# Altium footprint library microbuilder.PCBLIB: 422 footprints (part 13 of 27)
Each footprint in its own frame and in the unit in brackets; x right, y up, seen from the top. Pads: shape width x height; smd on the part's side, far side on the other; paste and mask are expansions set on the pad; w line width, h text height; cw(c..) or ccw(c..) is an arc to the next point about the centre after c.
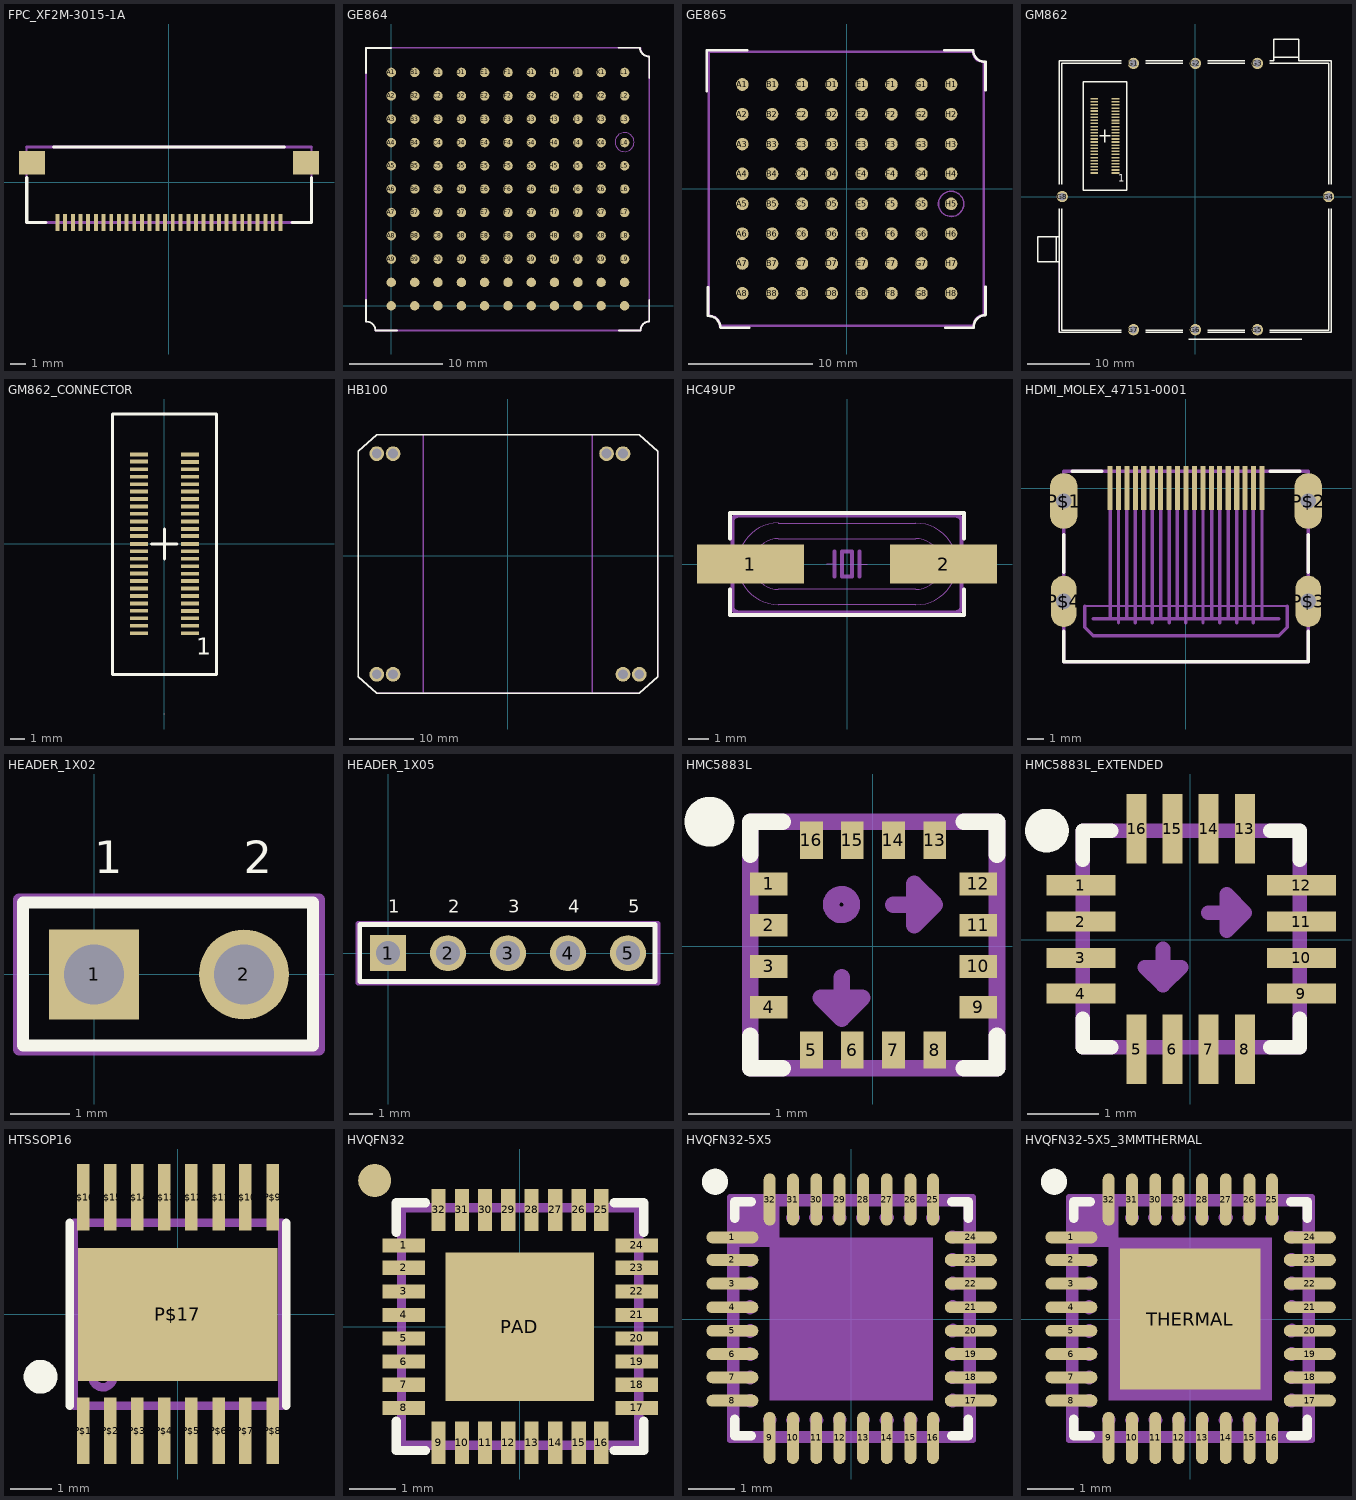
[diagram p12: the footprints below, top view; thin cyan lines are the x and y axes]

## FPC_XF2M-3015-1A [mil]
pads (32):
  rect 10x44 smd: P$1(286,-103.54) P$2(266,-103.54) P$3(247,-103.54) P$4(227,-103.54) P$5(207,-103.54) P$6(188,-103.54) P$7(168,-103.54) P$8(148,-103.54) P$9(128,-103.54) P$10(109,-103.54) P$11(89,-103.54) P$12(69,-103.54) P$13(50,-103.54) P$14(30,-103.54) P$15(10,-103.54) P$16(-9.84,-103.54) P$17(-29.53,-103.54) P$18(-49.21,-103.54) P$19(-68.9,-103.54) P$20(-88.58,-103.54) P$21(-108.27,-103.54) P$22(-127.95,-103.54) P$23(-147.64,-103.54) P$24(-167.32,-103.54) P$25(-187.01,-103.54) P$26(-206.69,-103.54) P$27(-226.38,-103.54) P$28(-246.06,-103.54) P$29(-265.75,-103.54) P$30(-285.43,-103.54)
  rect 67x60 smd: SUPPORT1(351,50) SUPPORT2(-350.39,50)
Top Overlay:
  lines w8: -364.17,11 -364.17,-103.54 -314.96,-103.54 ; -295.28,90 296,90 ; 315,-103.54 365,-103.54 365,11
Mechanical 16:
  lines w5: -364.17,-103.54 -364.17,90 ; 365,-103.54 365,90
  lines w8: -364.17,-103.54 365,-103.54 ; -364.17,90 365,90
  text "Top" at -352.5,-51.57 h24.8
  text "1" at -290,-51.57 h24.8
  text "30" at 273,-51.57 h24.8
  text "1" at 283,-74.07 h24.8
  text "30" at -297.5,-74.07 h24.8
  text "Bot" at -347.5,-74.07 h24.8

## GE864 [mil]
pads (121):
  rrect100% 40x40 smd: A1(0,985) A2(0,886) A3(0,788) A4(0,689) A5(0,591) A6(0,493) A7(0,394) A8(0,296) A9(0,197) A10(0,99) A11(0,0) B1(99,985) B2(99,886) B3(99,788) B4(99,689) B5(99,591) B6(99,493) B7(99,394) B8(99,296) B9(99,197) B10(99,99) B11(99,0) C1(197,985) C2(197,886) C3(197,788) C4(197,689) C5(197,591) C6(197,493) C7(197,394) C8(197,296) C9(197,197) C10(197,99) C11(197,0) D1(296,985) D2(296,886) D3(296,788) D4(296,689) D5(296,591) D6(296,493) D7(296,394) D8(296,296) D9(296,197) D10(296,99) D11(296,0) E1(394,985) E2(394,886) E3(394,788) E4(394,689) E5(394,591) E6(394,493) E7(394,394) E8(394,296) E9(394,197) E10(394,99) E11(394,0) F1(493,985) F2(493,886) F3(493,788) F4(493,689) F5(493,591) F6(493,493) F7(493,394) F8(493,296) F9(493,197) F10(493,99) F11(493,0) G1(591,985) G2(591,886) G3(591,788) G4(591,689) G5(591,591) G6(591,493) G7(591,394) G8(591,296) G9(591,197) G10(591,99) G11(591,0) H1(689,985) H2(689,886) H3(689,788) H4(689,689) H5(689,591) H6(689,493) H7(689,394) H8(689,296) H9(689,197) H10(689,99) H11(689,0) J1(788,985) J2(788,886) J3(788,788) J4(788,689) J5(788,591) J6(788,493) J7(788,394) J8(788,296) J9(788,197) J10(788,99) J11(788,0) K1(886,985) K2(886,886) K3(886,788) K4(886,689) K5(886,591) K6(886,493) K7(886,394) K8(886,296) K9(886,197) K10(886,99) K11(886,0) L1(985,985) L2(985,886) L3(985,788) L4(985,689) L5(985,591) L6(985,493) L7(985,394) L8(985,296) L9(985,197) L10(985,99) L11(985,0)
Top Overlay:
  lines w8: -106,-67 -106,24 ; -106,982 -106,1088 0,1088 ; -105.33,-67.18 cw(c-103.42,-103.63) -66.93,-103.58 ; -66,-104 24,-104 ; 959,1089 1049,1089 ; 961,-105 1052,-105 ; 1050,1089 ccw(c1086.6,1089.53) 1089,1053 ; 1053,-104.33 cw(c1089.25,-102.24) 1089,-65.93 ; 1089,-66 1089,25 ; 1089,961 1089,1052
Mechanical 16:
  lines w5: -104.33,-66.93 cw(c-103.4,-103.4) -66.93,-104.33
  lines w8: -104.33,-66.93 cw(c-104.33,-64.96) -106.3,-64.96 -106.3,1089 1052,1089 ccw(c1088.08,1088.08) 1089,1052 1089,-66.93 ccw(c1088.27,-103.21) 1052,-104.33 -66.93,-104.33
Mechanical 27:
  circle w5: c985,691 r40

## GE865 [mil]
pads (64):
  rrect100% 40x40 smd: A1(-330.71,331) A2(-330.71,237) A3(-330.71,142) A4(-330.71,48) A5(-330.71,-47.24) A6(-330.71,-141.73) A7(-330.71,-236.22) A8(-330.71,-330.71) B1(-236.22,331) B2(-236.22,237) B3(-236.22,142) B4(-236.22,48) B5(-236.22,-47.24) B6(-236.22,-141.73) B7(-236.22,-236.22) B8(-236.22,-330.71) C1(-141.73,331) C2(-141.73,237) C3(-141.73,142) C4(-141.73,48) C5(-141.73,-47.24) C6(-141.73,-141.73) C7(-141.73,-236.22) C8(-141.73,-330.71) D1(-47.24,331) D2(-47.24,237) D3(-47.24,142) D4(-47.24,48) D5(-47.24,-47.24) D6(-47.24,-141.73) D7(-47.24,-236.22) D8(-47.24,-330.71) E1(48,331) E2(48,237) E3(48,142) E4(48,48) E5(48,-47.24) E6(48,-141.73) E7(48,-236.22) E8(48,-330.71) F1(142,331) F2(142,237) F3(142,142) F4(142,48) F5(142,-47.24) F6(142,-141.73) F7(142,-236.22) F8(142,-330.71) G1(237,331) G2(237,237) G3(237,142) G4(237,48) G5(237,-47.24) G6(237,-141.73) G7(237,-236.22) G8(237,-330.71) H1(331,331) H2(331,237) H3(331,142) H4(331,48) H5(331,-47.24) H6(331,-141.73) H7(331,-236.22) H8(331,-330.71)
Top Overlay:
  lines w8: -443.33,310 -443.33,440 -315.33,440 ; -439.39,-402.39 -439.39,-311.39 ; -438.72,-402.57 cw(c-436.82,-439.02) -400.32,-438.98 ; -399.39,-439.39 -309.39,-439.39 ; 310,440 400,440 ; 312,-439.39 403,-439.39 ; 401,439 ccw(c437.1,439.05) 439,403 ; 403,-438.72 cw(c439.24,-436.63) 439,-400.32 ; 440,-399.39 440,-309.39 ; 440,312 440,403
Mechanical 16:
  lines w8: -437.01,-401.57 -437.01,434 401,434 ccw(c431.72,433.7) 433,403 ; -436.76,-402.57 cw(c-433.61,-434.56) -401.5,-433.07 402,-433.07 ; 403,-432.82 cw(c433.74,-431.49) 434,-400.72 434,403
Mechanical 27:
  circle w5: c331,-47.24 r40

## GM862 [mil]
pads (58):
  rect 48x10 smd: 1(-507.8,150) 2(-641.67,150) 3(-507.8,169) 4(-641.67,170) 5(-507.8,189) 6(-641.67,189) 7(-507.8,209) 8(-641.67,209) 9(-507.8,228) 10(-641.67,229) 11(-507.85,248) 12(-641.67,248) 13(-507.8,268) 14(-641.67,268) 15(-507.8,288) 16(-641.67,288) 17(-507.8,307) 18(-641.67,307) 19(-507.8,327) 20(-641.67,327) 21(-507.8,347) 22(-641.67,347) 23(-507.8,366) 24(-641.67,366) 25(-507.8,386) 26(-641.67,386) 27(-507.8,406) 28(-641.67,406) 29(-507.8,425) 30(-641.67,425) 31(-507.8,445) 32(-641.67,445) 33(-507.8,465) 34(-641.67,465) 35(-507.8,484) 36(-641.67,485) 37(-507.8,504) 38(-641.67,504) 39(-507.8,524) 40(-641.67,524) 41(-507.8,543) 42(-641.67,544) 43(-507.8,563) 44(-641.67,563) 45(-507.8,583) 46(-641.67,583) 47(-507.8,603) 48(-641.67,603) 49(-507.8,622) 50(-641.67,622)
  round 72 hole 48: G1(-393.7,847) G2(0,847) G3(394,847) G4(847,0) G5(394,-846.46) G6(0,-846.46) G7(-393.7,-846.46) G8(-846.46,0)
Top Overlay:
  lines w8: -864.17,-78.74 -864.17,-255.91 ; -864.17,79 -864.17,865 -472.44,865 ; -848.43,-78.74 -848.43,-848.43 -472.44,-848.43 ; -848.43,79 -848.43,849 -472.44,849 ; -608.2,386 -541.27,386 ; -574.73,347 -574.73,425 ; -472.44,-864.17 -864.17,-864.17 -864.17,-413.39 ; -314.96,-864.17 -78.74,-864.17 ; -314.96,-848.43 -78.74,-848.43 ; -314.96,849 -78.74,849 ; -314.96,865 -78.74,865 ; -43.31,-905.51 678,-905.51 ; 79,-864.17 315,-864.17 ; 79,-848.43 315,-848.43 ; 79,849 315,849 ; 79,865 315,865 ; 473,-864.17 865,-864.17 865,-78.74 ; 473,-848.43 849,-848.43 849,-78.74 ; 473,849 849,849 849,79 ; 473,865 500,865 500,886 ; 865,79 865,865 658,865 658,886 ; -885.83,-413.39 -1001.97,-413.39 -1001.97,-255.91 -885.83,-255.91 ; -885.83,-413.39 -864.17,-413.39 ; -885.83,-413.39 -885.83,-255.91 ; -885.83,-255.91 -864.17,-255.91 ; -864.17,-413.39 -864.17,-255.91 ; 500,886 500,1002 658,1002 658,886 ; 500,886 658,886 ; -712.6,40 -437.01,40 -437.01,729 -712.6,729 -712.6,40
  text "1" at -490,78 h77.5
Mechanical 16:
  lines w8: -864.17,-864.17 -864.17,-413.39
  text "GSM" at -900,-399 h77.5
  text "GPS" at 517,900 h77.5

## GM862_CONNECTOR [mil]
pads (58):
  rect 48x10 smd: 1(68,-236.85) 2(-66.67,-236.72) 3(68,-217.17) 4(-66.67,-217.03) 5(68,-197.48) 6(-66.67,-197.35) 7(68,-177.8) 8(-66.67,-177.66) 9(68,-158.11) 10(-66.67,-157.98) 11(68,-138.48) 12(-66.67,-138.29) 13(68,-118.74) 14(-66.67,-118.61) 15(68,-99.06) 16(-66.67,-98.92) 17(68,-79.37) 18(-66.67,-79.24) 19(68,-59.69) 20(-66.67,-59.55) 21(68,-40) 22(-66.67,-39.87) 23(68,-20.32) 24(-66.67,-20.18) 25(68,-0.63) 26(-66.67,-0.5) 27(68,20) 28(-66.67,20) 29(68,39) 30(-66.67,39) 31(68,59) 32(-66.67,59) 33(68,79) 34(-66.67,79) 35(68,98) 36(-66.67,98) 37(68,118) 38(-66.67,118) 39(68,138) 40(-66.67,138) 41(68,157) 42(-66.67,157) 43(68,177) 44(-66.67,177) 45(68,197) 46(-66.67,197) 47(68,216) 48(-66.67,217) 49(68,236) 50(-66.67,236)
  round 1 hole 1: G1(0,-450) G2(0,-450) G3(0,-450) G4(0,-450) G5(0,-450) G6(0,-450) G7(0,-450) G8(0,-450)
Top Overlay:
  lines w8: -33.2,-0.63 34,-0.63 ; 1,-40 1,39 ; -137.6,-346.63 138,-346.63 138,343 -137.6,343 -137.6,-346.63
  text "1" at 85,-309 h77.5

## HB100 [mil]
pads (8):
  round 90 hole 60: 5V@1(-701.18,624) 5V@2(-801.18,624) GND@1(702,624) GND@2(602,624) GND@3(802,-723.23) GND@4(702,-723.23) IF@1(-701.18,-723.23) IF@2(-801.18,-723.23)
Top Overlay:
  lines w8: -915.35,-737.4 -915.35,638 -801.18,738 802,738 916,638 916,-737.4 802,-837.4 -800,-837.4 -915.35,-737.4
Mechanical 16:
  lines w5: -915.35,-737.4 -915.35,638 -801.18,738 -515.75,738 516,738 802,738 916,638 916,-737.4 802,-837.4 516,-837.4 -800,-837.4 -915.35,-737.4
  lines w8: -515.75,-837.4 -515.75,738 ; 516,-837.4 516,738
Mechanical 30:
  lines w5: -801.18,-837.4 -800,-837.4

## HC49UP [mil]
pads (2):
  rect 210x76 smd: 1(-190,0) 2(190,0)
Top Overlay:
  lines w8: -230,-50 -230,-100 230,-100 230,-50 ; -230,50 -230,100 230,100 230,50
Mechanical 16:
  lines w2: -135,80 135,80 cw(c135.43,-0.81) 202,45 cw(c135.85,0) 202,-45 cw(c135.42,0.81) 135,-80 -135,-80 cw(c-135,0) -201.15,-45 cw(c-135,0) -201.15,45 cw(c-134.06,0.5) -135,81 ; -40,0 -25,0 ; 25,0 40,0 ; -156.8,-45 cw(c-135,0) -156.8,45 cw(c-135,0) -135,50 135,50 cw(c135.1,-0.45) 157,45 cw(c135.2,0) 157,-45 cw(c135.1,0.45) 135,-50 -135,-50 cw(c-135,0) -156.8,-45
  lines w8: -25,-25 -25,0 -25,25 ; 25,-25 25,0 25,25 ; 225,-15 255,-15 255,15 225,15 ; -225,-15 -225,15 ; -225,-15 -225,-85 ccw(c-215,-85) -215,-95 215,-95 ccw(c215,-85) 225,-85 225,85 ccw(c215,85) 215,95 -215,95 ccw(c-215,85) -225,85 -225,15 ; -225,-15 -255,-15 -255,15 -225,15 ; -10,-25 -10,25 10,25 10,-25 -10,-25
Via Holes:
  rectangle: -260,-120 260,120

## HDMI_MOLEX_47151-0001 [mil]
pads (23):
  rect 12x103 smd: 1(178,0) 2(158,0) 3(138,0) 4(119,0) 5(99,0) 6(79,0) 7(60,0) 8(40,0) 9(20,0) 10(0,0) 11(-19.68,0) 12(-39.37,0) 13(-59.06,0) 14(-78.74,0) 15(-98.43,0) 16(-118.11,0) 17(-137.8,0) 18(-157.48,0) 19(-177.17,0)
  oval 65x130 hole 36: P$1(-285.43,-29.92) P$2(286,-29.92)
  oval 60x120 hole 36: P$3(286,-264.57) P$4(-285.43,-264.57)
Top Overlay:
  lines w8: -285.43,-334.65 -285.43,-405.91 286,-405.91 286,-334.65 ; -285.43,-196.85 -285.43,-108.27 ; -265.75,40 -196.85,40 ; 197,40 266,40 ; 286,-196.85 286,-108.27
Mechanical 11:
  lines w0: -303.15,-280.31 -303.15,-248.82 cw(c-285.43,-248.82) -285.43,-231.1 cw(c-285.43,-248.82) -267.72,-248.82 -267.72,-280.31 cw(c-285.43,-280.31) -285.43,-298.03 cw(c-285.43,-280.31) -303.15,-280.31 ; -303.15,-64.96 -303.15,6 cw(c-285.29,6.14) -285.43,24 cw(c-285.57,6.14) -267.72,6 -267.72,-64.96 cw(c-285.43,-64.96) -285.43,-82.68 cw(c-285.43,-64.96) -303.15,-64.96 ; 268,-280.31 268,-248.82 cw(c285.86,-248.96) 286,-231.1 cw(c286.14,-248.96) 304,-248.82 304,-280.31 cw(c286.14,-280.17) 286,-298.03 cw(c285.86,-280.17) 268,-280.31 ; 268,-64.96 268,6 cw(c286,6) 286,24 cw(c286,6) 304,6 304,-64.96 cw(c286.14,-64.82) 286,-82.68 cw(c285.86,-64.82) 268,-64.96
Mechanical 16:
  lines w5: -236.22,-275.59 237,-275.59
  lines w8: -236.22,-275.59 -236.22,-324.8 -216.54,-344.49 217,-344.49 237,-324.8 237,-275.59 ; -216.54,-305.12 -177.17,-305.12 ; -177.17,-49.21 -177.17,-295.28 -177.17,-305.12 ; -157.48,-314.96 -157.48,-305.12 ; -157.48,-49.21 -157.48,-305.12 ; -137.8,-49.21 -137.8,-295.28 -137.8,-305.12 ; -118.11,-314.96 -118.11,-305.12 ; -118.11,-49.21 -118.11,-305.12 ; -98.43,-49.21 -98.43,-295.28 -98.43,-305.12 ; -78.74,-314.96 -78.74,-305.12 ; -78.74,-49.21 -78.74,-305.12 ; -59.06,-49.21 -59.06,-295.28 -59.06,-305.12 ; -39.37,-314.96 -39.37,-305.12 ; -39.37,-49.21 -39.37,-305.12 ; -19.68,-49.21 -19.68,-295.28 -19.68,-305.12 ; 0,-314.96 0,-305.12 ; 0,-49.21 0,-305.12 ; 20,-49.21 20,-295.28 20,-305.12 ; 40,-314.96 40,-305.12 ; 40,-49.21 40,-305.12 ; 60,-49.21 60,-295.28 60,-305.12 ; 79,-314.96 79,-305.12 ; 79,-49.21 79,-305.12 ; 99,-49.21 99,-295.28 99,-305.12 ; 119,-314.96 119,-305.12 ; 119,-49.21 119,-305.12 ; 138,-49.21 138,-295.28 138,-305.12 ; 158,-314.96 158,-305.12 ; 158,-49.21 158,-305.12 ; 178,-49.21 178,-295.28 178,-305.12 ; 217,-305.12 178,-305.12 ; -177.17,-305.12 -157.48,-305.12 ; -157.48,-305.12 -137.8,-305.12 ; -137.8,-305.12 -118.11,-305.12 ; -118.11,-305.12 -98.43,-305.12 ; -98.43,-305.12 -78.74,-305.12 ; -78.74,-305.12 -59.06,-305.12 ; -59.06,-305.12 -39.37,-305.12 ; -39.37,-305.12 -19.68,-305.12 ; -19.68,-305.12 0,-305.12 ; 0,-305.12 20,-305.12 ; 20,-305.12 40,-305.12 ; 40,-305.12 60,-305.12 ; 60,-305.12 79,-305.12 ; 79,-305.12 99,-305.12 ; 99,-305.12 119,-305.12 ; 119,-305.12 138,-305.12 ; 138,-305.12 158,-305.12 ; 158,-305.12 178,-305.12 ; -285.43,-405.91 -285.43,40 286,40 286,-405.91 -285.43,-405.91
Mechanical 27:
  lines w5: -285.43,-405.91 -285.43,40 286,40 286,-405.91 -285.43,-405.91

## HEADER_1X02 [mil]
pads (2):
  rect 60x60 hole 40: 1(0,0)
  round 60 hole 40: 2(100,0)
Top Overlay:
  lines w8: -47.24,-47.24 146,-47.24 146,48 -47.24,48 -47.24,-47.24
  text "1" at 0,60 h37.2
  text "2" at 100,60 h37.2
Mechanical 16:
  rectangle: -10,-10 10,10
  rectangle: 90,-10 110,10
Mechanical 27:
  lines w8: -50,-50 150,-50 150,50 -50,50 -50,-50

## HEADER_1X05 [mil]
pads (5):
  rect 60x60 hole 40: 1(0,0)
  round 60 hole 40: 2(100,0) 3(200,0) 4(300,0) 5(400,0)
Top Overlay:
  lines w8: -47.24,-47.24 445,-47.24 445,48 -47.24,48 -47.24,-47.24
  text "1" at 0,60 h37.2
  text "2" at 100,60 h37.2
  text "3" at 200,60 h37.2
  text "4" at 300,60 h37.2
  text "5" at 400,60 h37.2
Mechanical 16:
  rectangle: 390,-10 410,10
  rectangle: 290,-10 310,10
  rectangle: 190,-10 210,10
  rectangle: 90,-10 110,10
  rectangle: -10,-10 10,10
Mechanical 27:
  lines w8: -50,-50 450,-50 450,50 -50,50 -50,-50

## HMC5883L [mil]
pads (16):
  rect 18x11 smd: 1(-50.2,30) 2(-50.2,10) 3(-50.2,-9.84) 4(-50.2,-29.53) 9(51,-29.53) 10(51,-9.84) 11(51,10) 12(51,30)
  rect 11x18 smd: 5(-29.53,-50.2) 6(-9.84,-50.2) 7(10,-50.2) 8(30,-50.2) 13(30,51) 14(10,51) 15(-9.84,51) 16(-29.53,51)
Top Overlay:
  circle w12: c-78.74,60 r6
  lines w8: -59.06,-43.31 -59.06,-59.06 -43.31,-59.06 ; -59.06,44 -59.06,60 -43.31,60 ; 44,-59.06 60,-59.06 60,-43.31 ; 44,60 60,60 60,44
Mechanical 16:
  circle w8: c-15,20 r5
  lines w8: -15,-15 -15,-30 ; 10,20 25,20 ; -20,-25 -25,-25 -15,-35 ; -20,-25 -15,-30 ; -20,-25 -10,-25 ; -15,-35 -5,-25 -10,-25 ; -15,-35 -15,-30 ; -15,-30 -10,-25 ; 20,15 20,10 30,20 ; 20,15 25,20 ; 20,15 20,25 ; 20,25 20,30 30,20 ; 20,25 25,20 ; 25,20 30,20 ; -59.06,-59.06 60,-59.06 60,60 -59.06,60 -59.06,-59.06
  text "X" at -20,-10 h24.8
  text "Y" at -5,10 h24.8
  text "Z" at -35,30 h24.8

## HMC5883L_EXTENDED [mil]
pads (16):
  rect 38x11 smd: 1(-60.04,30) 2(-60.04,10) 3(-60.04,-9.84) 4(-60.04,-29.53) 9(61,-29.53) 10(61,-9.84) 11(61,10) 12(61,30)
  rect 11x38 smd: 5(-29.53,-60.04) 6(-9.84,-60.04) 7(10,-60.04) 8(30,-60.04) 13(30,61) 14(10,61) 15(-9.84,61) 16(-29.53,61)
Top Overlay:
  circle w12: c-78.74,60 r6
  lines w8: -59.06,-43.31 -59.06,-59.06 -43.31,-59.06 ; -59.06,44 -59.06,60 -43.31,60 ; 44,-59.06 60,-59.06 60,-43.31 ; 44,60 60,60 60,44
Mechanical 16:
  lines w8: -15,-5 -15,-20 ; 10,15 25,15 ; -20,-15 -25,-15 -15,-25 ; -20,-15 -15,-20 ; -20,-15 -10,-15 ; -15,-25 -5,-15 -10,-15 ; -15,-25 -15,-20 ; -15,-20 -10,-15 ; 20,10 20,5 30,15 ; 20,10 25,15 ; 20,10 20,20 ; 20,20 20,25 30,15 ; 20,20 25,15 ; 25,15 30,15 ; -59.06,-59.06 60,-59.06 60,60 -59.06,60 -59.06,-59.06
  text "XY" at -20,5 h24.8

## HTSSOP16 [mil]
pads (17):
  rect 12x63 smd: P$1(-89.57,-110.24) P$2(-63.98,-110.24) P$3(-38.39,-110.24) P$4(-12.8,-110.24) P$5(13,-110.24) P$6(39,-110.24) P$7(64,-110.24) P$8(90,-110.24) P$9(90,111) P$10(64,111) P$11(39,111) P$12(13,111) P$13(-12.8,111) P$14(-38.39,111) P$15(-63.98,111) P$16(-89.57,111)
  rect 189x126 smd: P$17(0,0)
Top Overlay:
  circle w16: c-129.92,-59.06 r8
  lines w8: -102.36,-86.61 -102.36,87 ; 103,-86.61 103,87
Top Paste:
  rectangle: -45.47,-48.43 46,49
Mechanical 16:
  circle w8: c-70.87,-59.06 r10
  lines w8: -98.43,-86.61 99,-86.61 99,87 -98.43,87 -98.43,-86.61

## HVQFN32 [mil]
pads (34):
  rect 36x12 smd: 1(-98.43,69) 2(-98.43,50) 3(-98.43,30) 4(-98.43,10) 5(-98.43,-9.84) 6(-98.43,-29.53) 7(-98.43,-49.21) 8(-98.43,-68.9) 17(99,-68.9) 18(99,-49.21) 19(99,-29.53) 20(99,-9.84) 21(99,10) 22(99,30) 23(99,50) 24(99,69)
  rect 12x36 smd: 9(-68.9,-98.43) 10(-49.21,-98.43) 11(-29.53,-98.43) 12(-9.84,-98.43) 13(10,-98.43) 14(30,-98.43) 15(50,-98.43) 16(69,-98.43) 25(69,99) 26(50,99) 27(30,99) 28(10,99) 29(-9.84,99) 30(-29.53,99) 31(-49.21,99) 32(-68.9,99)
  rrect100% 28x28 smd: DNC(FIDUCIAL)(-123.11,124)
  rect 126x126 smd: PAD(0,0)
Top Overlay:
  lines w8: -105,-80 -105,-105 -80,-105 ; -105,80 -105,105 -80,105 ; 80,-105 105,-105 105,-80 ; 80,105 105,105 105,80
Top Paste:
  rectangle: -56.3,-56.3 57,57
Mechanical 16:
  lines w8: -100.39,-100.39 101,-100.39 101,101 -100.39,101 -100.39,-100.39

## HVQFN32-5X5 [mil]
pads (32):
  rrect100% 44x10 smd: 1(-100.39,69) 2(-100.39,50) 3(-100.39,30) 4(-100.39,10) 5(-100.39,-9.84) 6(-100.39,-29.53) 7(-100.39,-49.21) 8(-100.39,-68.9) 17(101,-68.9) 18(101,-49.21) 19(101,-29.53) 20(101,-9.84) 21(101,10) 22(101,30) 23(101,50) 24(101,69)
  rrect100% 10x44 smd: 9(-68.9,-100.39) 10(-49.21,-100.39) 11(-29.53,-100.39) 12(-9.84,-100.39) 13(10,-100.39) 14(30,-100.39) 15(50,-100.39) 16(69,-100.39) 25(69,101) 26(50,101) 27(30,101) 28(10,101) 29(-9.84,101) 30(-29.53,101) 31(-49.21,101) 32(-68.9,101)
Top Overlay:
  circle w12: c-115.06,116 r5
  lines w8: -98.43,-84.65 -98.43,-98.43 -84.65,-98.43 ; -98.43,85 -98.43,99 -84.65,99 ; 85,-98.43 99,-98.43 99,-84.65 ; 85,99 99,99 99,85
Top Paste:
  rectangle: -112.2,64 -84.65,74
  region: -63.9,85.22 -63.9,112.78 -73.9,112.78 -73.9,85.22
  region: 74.5,85.5 74.5,112.5 64.5,112.5 64.5,85.5
  rectangle: 85,64 113,74
  rectangle: -112.2,-73.82 -84.65,-63.98
  region: -63.98,-112.2 -63.98,-84.65 -73.82,-84.65 -73.82,-112.2
  region: 74.42,-111.93 74.42,-84.93 64.58,-84.93 64.58,-111.93
  rectangle: 85,-73.82 113,-63.98
Top Solder:
  circle w0: c-115.16,116 r15
Mechanical 16:
  rectangle: -96.46,61 -60.63,97
  region: -85.02,64.58 -85.02,74.42 -100.02,74.42 -100.02,64.58
  region: -84.52,45.08 -84.52,54.92 -100.52,54.92 -100.52,45.08
  region: -84.52,25.08 -84.52,34.92 -100.52,34.92 -100.52,25.08
  region: -84.52,5.08 -84.52,14.92 -100.52,14.92 -100.52,5.08
  region: -84.65,-14.76 -84.65,-4.92 -100.39,-4.92 -100.39,-14.76
  region: -84.65,-34.45 -84.65,-24.61 -100.39,-24.61 -100.39,-34.45
  region: -84.65,-54.13 -84.65,-44.29 -100.39,-44.29 -100.39,-54.13
  region: -84.65,-73.82 -84.65,-63.98 -100.39,-63.98 -100.39,-73.82
  region: -63.98,-84.65 -73.82,-84.65 -73.82,-100.39 -63.98,-100.39
  region: -44.29,-84.65 -54.13,-84.65 -54.13,-100.39 -44.29,-100.39
  region: -24.61,-84.65 -34.45,-84.65 -34.45,-100.39 -24.61,-100.39
  region: -4.92,-84.65 -14.76,-84.65 -14.76,-100.39 -4.92,-100.39
  region: 15,-84.65 5,-84.65 5,-100.39 15,-100.39
  region: 35,-84.65 25,-84.65 25,-100.39 35,-100.39
  region: 55,-84.65 45,-84.65 45,-100.39 55,-100.39
  region: 74,-84.65 64,-84.65 64,-100.39 74,-100.39
  region: 85.13,-63.9 85.13,-73.9 100.87,-73.9 100.87,-63.9
  region: 85.13,-44.21 85.13,-54.21 100.87,-54.21 100.87,-44.21
  region: 85.13,-24.53 85.13,-34.53 100.87,-34.53 100.87,-24.53
  region: 85.13,-4.84 85.13,-14.84 100.87,-14.84 100.87,-4.84
  region: 85,15 85,5 101,5 101,15
  region: 85,35 85,25 101,25 101,35
  region: 85,55 85,45 101,45 101,55
  region: 85.5,74.5 85.5,64.5 100.5,64.5 100.5,74.5
  rectangle: 64,85 74,101
  rectangle: 45,85 55,101
  rectangle: 25,85 35,101
  rectangle: 5,85 15,101
  rectangle: -14.76,85 -4.92,101
  rectangle: -34.45,85 -24.61,101
  rectangle: -54.13,85 -44.29,101
  rectangle: -73.82,85 -63.98,101
  lines w8: -85.63,-70.87 ccw(c-85.63,-69) -85.63,-67.13 ; -85.63,-51.18 ccw(c-85.63,-49.31) -85.63,-47.44 ; -85.63,-31.5 ccw(c-85.63,-29.63) -85.63,-27.76 ; -85.63,-11.81 ccw(c-85.63,-9.94) -85.63,-8.07 ; -85.63,8 ccw(c-85.63,10) -85.63,12 ; -85.63,28 ccw(c-85.63,30) -85.63,32 ; -85.63,48 ccw(c-85.63,49.5) -85.63,51 ; -85.63,67 ccw(c-85.63,69) -85.63,71 ; -70.87,86 ccw(c-69,86) -67.13,86 ; -70.67,-85.63 cw(c-68.8,-85.63) -66.93,-85.63 ; -51.18,86 ccw(c-49.31,86) -47.44,86 ; -50.98,-85.63 cw(c-49.11,-85.63) -47.24,-85.63 ; -31.5,86 ccw(c-29.63,86) -27.76,86 ; -31.3,-85.63 cw(c-29.43,-85.63) -27.56,-85.63 ; -11.81,86 ccw(c-9.94,86) -8.07,86 ; -11.61,-85.63 cw(c-9.74,-85.63) -7.87,-85.63 ; 8,86 ccw(c10,86) 12,86 ; 9,-85.63 cw(c10.5,-85.63) 12,-85.63 ; 28,-85.63 cw(c30,-85.63) 32,-85.63 ; 28,86 ccw(c30,86) 32,86 ; 48,-85.63 cw(c50,-85.63) 52,-85.63 ; 48,86 ccw(c49.5,86) 51,86 ; 67,86 ccw(c69,86) 71,86 ; 68,-85.63 cw(c69.5,-85.63) 71,-85.63 ; 86,-70.67 cw(c86,-68.8) 86,-66.93 ; 86,-50.98 cw(c86,-49.11) 86,-47.24 ; 86,-31.3 cw(c86,-29.43) 86,-27.56 ; 86,-11.61 cw(c86,-9.74) 86,-7.87 ; 86,9 cw(c86,10.5) 86,12 ; 86,28 cw(c86,30) 86,32 ; 86,48 cw(c86,50) 86,52 ; 86,68 cw(c86,69.5) 86,71 ; -98.43,-98.43 99,-98.43 99,99 -98.43,99 -98.43,-98.43
Mechanical 27:
  rectangle: -68.9,-68.9 69,69
  lines w5: -102.36,-102.36 -102.36,103 103,103 103,-102.36 -102.36,-102.36

## HVQFN32-5X5_3MMTHERMAL [mil]
pads (33):
  rrect100% 44x10 smd: 1(-100.39,69) 2(-100.39,50) 3(-100.39,30) 4(-100.39,10) 5(-100.39,-9.84) 6(-100.39,-29.53) 7(-100.39,-49.21) 8(-100.39,-68.9) 17(101,-68.9) 18(101,-49.21) 19(101,-29.53) 20(101,-9.84) 21(101,10) 22(101,30) 23(101,50) 24(101,69)
  rrect100% 10x44 smd: 9(-68.9,-100.39) 10(-49.21,-100.39) 11(-29.53,-100.39) 12(-9.84,-100.39) 13(10,-100.39) 14(30,-100.39) 15(50,-100.39) 16(69,-100.39) 25(69,101) 26(50,101) 27(30,101) 28(10,101) 29(-9.84,101) 30(-29.53,101) 31(-49.21,101) 32(-68.9,101)
  rect 119x119 smd: THERMAL(0,0)
Top Overlay:
  circle w12: c-115.06,116 r5
  lines w8: -98.43,-84.65 -98.43,-98.43 -84.65,-98.43 ; -98.43,85 -98.43,99 -84.65,99 ; 85,-98.43 99,-98.43 99,-84.65 ; 85,99 99,99 99,85
Top Paste:
  rectangle: -112.2,64 -84.65,74
  region: -63.9,85.22 -63.9,112.78 -73.9,112.78 -73.9,85.22
  region: 74.5,85.5 74.5,112.5 64.5,112.5 64.5,85.5
  rectangle: 85,64 113,74
  rectangle: -112.2,-73.82 -84.65,-63.98
  region: -63.98,-112.2 -63.98,-84.65 -73.82,-84.65 -73.82,-112.2
  region: 74.42,-111.93 74.42,-84.93 64.58,-84.93 64.58,-111.93
  rectangle: 85,-73.82 113,-63.98
  rectangle: -49.21,10 -9.84,50
  rectangle: 10,10 50,50
  rectangle: -49.21,-49.21 -9.84,-9.84
  rectangle: 10,-49.21 50,-9.84
Top Solder:
  circle w0: c-115.16,116 r15
Mechanical 16:
  rectangle: -96.46,61 -60.63,97
  region: -85.02,64.58 -85.02,74.42 -100.02,74.42 -100.02,64.58
  region: -84.52,45.08 -84.52,54.92 -100.52,54.92 -100.52,45.08
  region: -84.52,25.08 -84.52,34.92 -100.52,34.92 -100.52,25.08
  region: -84.52,5.08 -84.52,14.92 -100.52,14.92 -100.52,5.08
  region: -84.65,-14.76 -84.65,-4.92 -100.39,-4.92 -100.39,-14.76
  region: -84.65,-34.45 -84.65,-24.61 -100.39,-24.61 -100.39,-34.45
  region: -84.65,-54.13 -84.65,-44.29 -100.39,-44.29 -100.39,-54.13
  region: -84.65,-73.82 -84.65,-63.98 -100.39,-63.98 -100.39,-73.82
  region: -63.98,-84.65 -73.82,-84.65 -73.82,-100.39 -63.98,-100.39
  region: -44.29,-84.65 -54.13,-84.65 -54.13,-100.39 -44.29,-100.39
  region: -24.61,-84.65 -34.45,-84.65 -34.45,-100.39 -24.61,-100.39
  region: -4.92,-84.65 -14.76,-84.65 -14.76,-100.39 -4.92,-100.39
  region: 15,-84.65 5,-84.65 5,-100.39 15,-100.39
  region: 35,-84.65 25,-84.65 25,-100.39 35,-100.39
  region: 55,-84.65 45,-84.65 45,-100.39 55,-100.39
  region: 74,-84.65 64,-84.65 64,-100.39 74,-100.39
  region: 85.13,-63.9 85.13,-73.9 100.87,-73.9 100.87,-63.9
  region: 85.13,-44.21 85.13,-54.21 100.87,-54.21 100.87,-44.21
  region: 85.13,-24.53 85.13,-34.53 100.87,-34.53 100.87,-24.53
  region: 85.13,-4.84 85.13,-14.84 100.87,-14.84 100.87,-4.84
  region: 85,15 85,5 101,5 101,15
  region: 85,35 85,25 101,25 101,35
  region: 85,55 85,45 101,45 101,55
  region: 85.5,74.5 85.5,64.5 100.5,64.5 100.5,74.5
  rectangle: 64,85 74,101
  rectangle: 45,85 55,101
  rectangle: 25,85 35,101
  rectangle: 5,85 15,101
  rectangle: -14.76,85 -4.92,101
  rectangle: -34.45,85 -24.61,101
  rectangle: -54.13,85 -44.29,101
  rectangle: -73.82,85 -63.98,101
  lines w8: -85.63,-70.87 ccw(c-85.63,-69) -85.63,-67.13 ; -85.63,-51.18 ccw(c-85.63,-49.31) -85.63,-47.44 ; -85.63,-31.5 ccw(c-85.63,-29.63) -85.63,-27.76 ; -85.63,-11.81 ccw(c-85.63,-9.94) -85.63,-8.07 ; -85.63,8 ccw(c-85.63,10) -85.63,12 ; -85.63,28 ccw(c-85.63,30) -85.63,32 ; -85.63,48 ccw(c-85.63,49.5) -85.63,51 ; -85.63,67 ccw(c-85.63,69) -85.63,71 ; -70.87,86 ccw(c-69,86) -67.13,86 ; -70.67,-85.63 cw(c-68.8,-85.63) -66.93,-85.63 ; -51.18,86 ccw(c-49.31,86) -47.44,86 ; -50.98,-85.63 cw(c-49.11,-85.63) -47.24,-85.63 ; -31.5,86 ccw(c-29.63,86) -27.76,86 ; -31.3,-85.63 cw(c-29.43,-85.63) -27.56,-85.63 ; -11.81,86 ccw(c-9.94,86) -8.07,86 ; -11.61,-85.63 cw(c-9.74,-85.63) -7.87,-85.63 ; 8,86 ccw(c10,86) 12,86 ; 9,-85.63 cw(c10.5,-85.63) 12,-85.63 ; 28,-85.63 cw(c30,-85.63) 32,-85.63 ; 28,86 ccw(c30,86) 32,86 ; 48,-85.63 cw(c50,-85.63) 52,-85.63 ; 48,86 ccw(c49.5,86) 51,86 ; 67,86 ccw(c69,86) 71,86 ; 68,-85.63 cw(c69.5,-85.63) 71,-85.63 ; 86,-70.67 cw(c86,-68.8) 86,-66.93 ; 86,-50.98 cw(c86,-49.11) 86,-47.24 ; 86,-31.3 cw(c86,-29.43) 86,-27.56 ; 86,-11.61 cw(c86,-9.74) 86,-7.87 ; 86,9 cw(c86,10.5) 86,12 ; 86,28 cw(c86,30) 86,32 ; 86,48 cw(c86,50) 86,52 ; 86,68 cw(c86,69.5) 86,71 ; -98.43,-98.43 99,-98.43 99,99 -98.43,99 -98.43,-98.43
Mechanical 27:
  rectangle: -68.9,-68.9 69,69
  lines w5: -102.36,-102.36 -102.36,103 103,103 103,-102.36 -102.36,-102.36